# Altium footprint library CADTcommon.PcbLib: 503 footprints (part 29 of 32)
Each footprint in its own frame and in the unit in brackets; x right, y up, seen from the top. Pads: shape width x height; smd on the part's side, far side on the other; paste and mask are expansions set on the pad; w line width, h text height; cw(c..) or ccw(c..) is an arc to the next point about the centre after c.
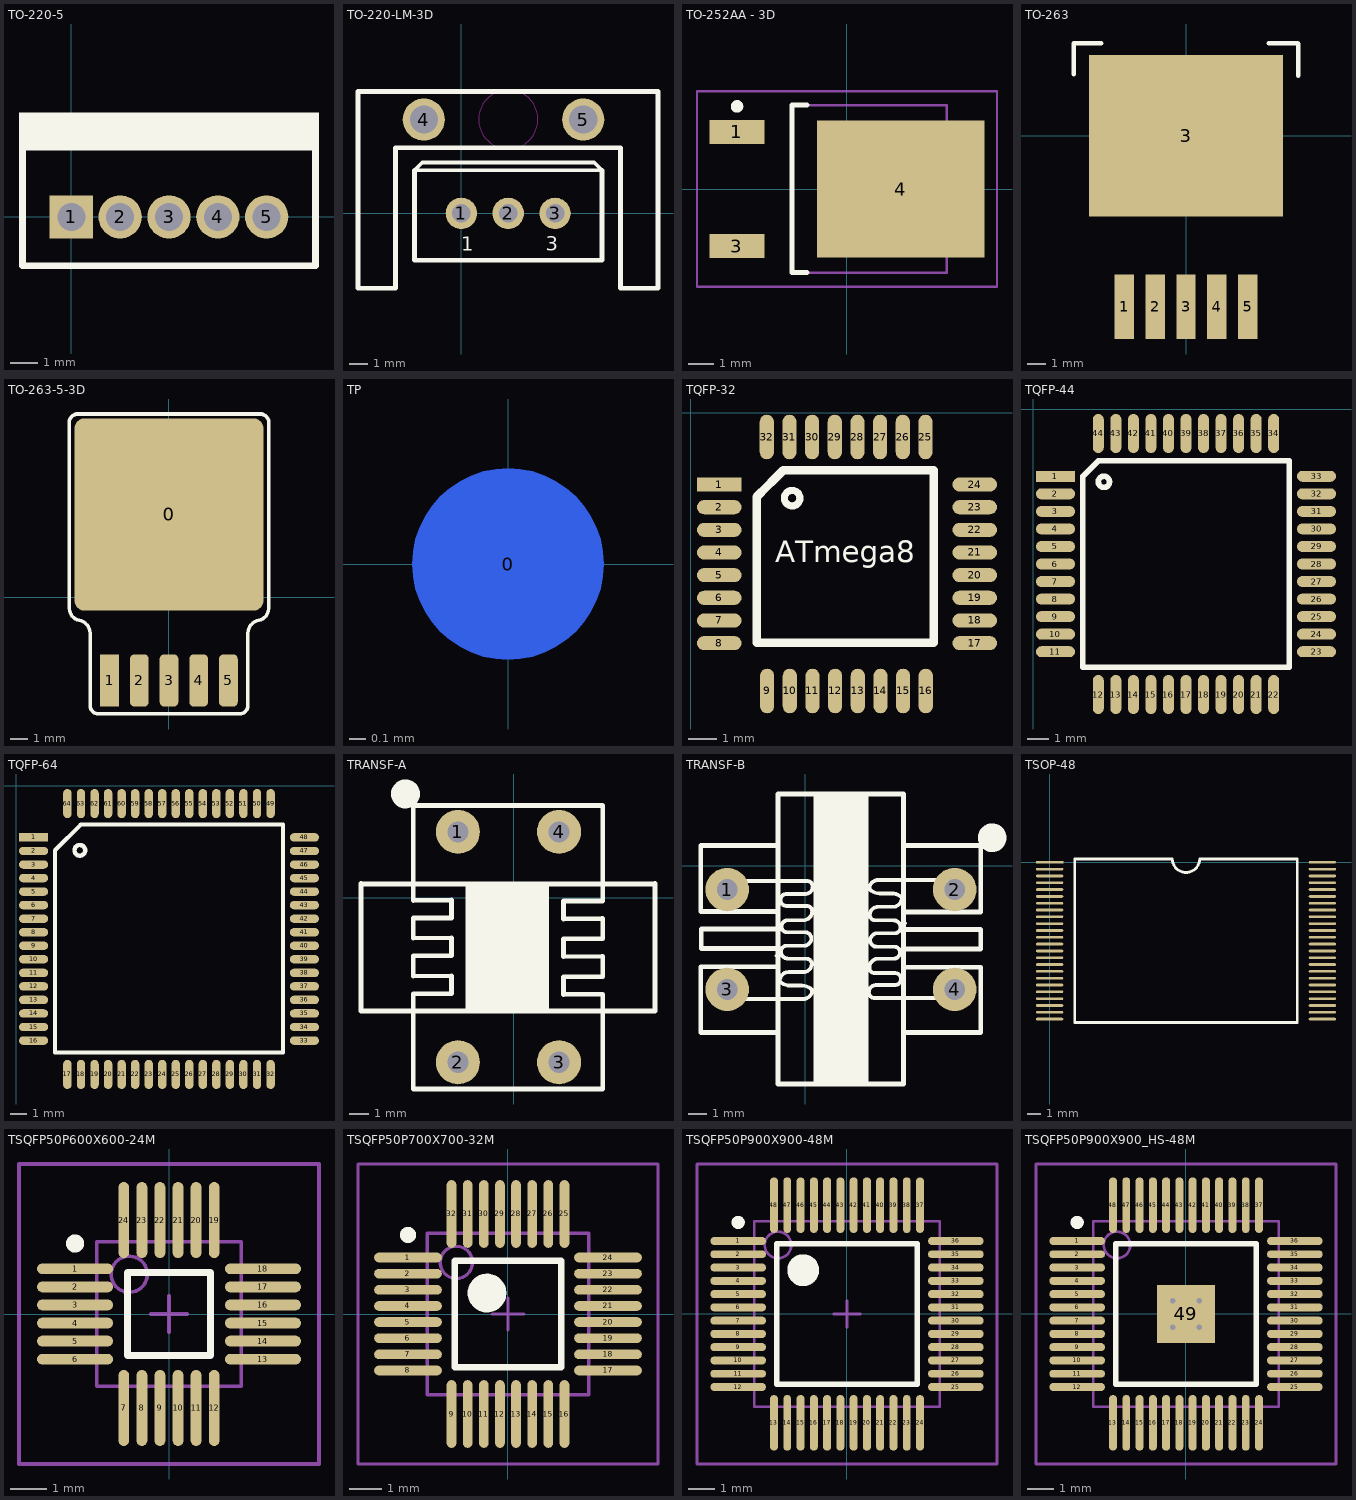
[diagram p28: the footprints below, top view; thin cyan lines are the x and y axes]

## TO-220-5 [mil]
pads (5):
  rect 62x62 hole 40: 1(0,0)
  round 62 hole 40: 2(70,0) 3(140,0) 4(210,0) 5(280,0)
Top Overlay:
  rectangle: -75,100 355,150
  lines w10: -70,-70 -70,100 350,100 350,-70 -70,-70

## TO-220-LM-3D [mm]
pads (5):
  round 1.7 hole 1: 1(0,0) 2(2.54,0) 3(5.08,0)
  round 2.286 hole 1.524: 4(-2.032,5.08) 5(6.604,5.08)
Top Overlay:
  lines w0.2: -2.54,2.328 -2.117,2.752 7.197,2.752 7.62,2.328 -2.54,2.328
  lines w0.254: -2.54,2.328 -2.54,-2.529 -2.529,-2.54 7.609,-2.54 7.62,-2.529 7.62,2.328 ; 10.657,3.556 10.657,6.604 ; 10.657,6.604 -5.599,6.604 -5.599,3.556 -5.599,1.016 -5.599,-4.064 -3.567,-4.064 -3.567,3.556 8.625,3.556 8.625,-4.064 10.657,-4.064 10.657,6.604
  text "1" at 0,-2.032 h0.76
  text "3" at 4.572,-2.032 h0.76
Keep-Out Layer:
  circle w0.025: c2.545,5.094 r1.606
3D body: height 21.07, standoff -4.86, extent -5.96,-5.775 11.04,4.445

## TO-252AA - 3D [mm] "D-PAK, 4-Leads, Body 6.1x6.5mm, Pitch 2.28mm, Lead Span 9.8mm, IPC Low Density"
height 2.38
pads (3):
  rect 2.2x0.95 smd: 1(-4.4,2.28) 3(-4.4,-2.28)
  rect 6.7x5.5 smd: 4(2.15,0)
Top Overlay:
  circle w0.25: c-4.4,3.305 r0.125
  lines w0.2: -1.6,-3.35 -2.2,-3.35 -2.2,3.35 -1.6,3.35
Mechanical 13:
  lines w0.1: -2.2,-3.35 -2.2,3.35 4,3.35 4,-3.35 -2.2,-3.35
Mechanical 15:
  lines w0.1: -0.5,0 0.5,0 ; 0,-0.5 0,0.5 ; -6,-3.9 -6,3.9 6,3.9 6,-3.9 -6,-3.9
3D body: height 2.39, standoff -0.02, extent -4.9,-3.27 5.038,3.27

## TO-263 [mil]
pads (6):
  rect 42x140 smd: 1(-134,-370) 2(-67,-370) 3(0,-370) 4(67,-370) 5(134,-370)
  rect 420x350 smd: 3(0,0)
Top Overlay:
  lines w10: -243,134 -243,201 -184,201 ; 179,201 242,201 243,200 243,130

## TO-263-5-3D [mm]
pads (6):
  rrect10% 10.8x11 smd: 0(0,4.75)
  rect 1.07x3 smd: 1(-3.4,-4.75)
  rrect50% 1.07x3 smd: 2(-1.7,-4.75) 3(0,-4.75) 4(1.7,-4.75) 5(3.4,-4.75)
Top Overlay:
  lines w0.2: -4.512,-6.122 ccw(c-4.028,-6.181) -4.125,-6.659 ; 4.125,-6.659 ccw(c4.028,-6.181) 4.512,-6.122
  lines w0.203: -5.7,10.05 -5.7,-0.53 ccw(c-5.005,-0.615) -5.145,-1.301 cw(c-5.306,-2.084) -4.512,-2.181 -4.512,-6.122 ; -5.7,10.109 cw(c-5.222,10.011) -5.299,10.493 ; -5.3,10.5 5.3,10.5 ; -4.125,-6.659 4.125,-6.659 ; 4.512,-6.122 4.512,-2.181 cw(c5.306,-2.084) 5.145,-1.301 ccw(c5.005,-0.615) 5.7,-0.53 5.7,10.05 ; 5.299,10.493 cw(c5.222,10.011) 5.7,10.109
3D body: height 4.48, standoff 0, extent -5.137,-4.801 5.086,9.55

## TP [mm]
pads (1):
  round 1.2 smd far side: 0(0,0)
Bottom Overlay:
  circle w0.2: c0,0 r0.94

## TQFP-32 [mil]
pads (32):
  rect 62x19.68 smd: 1(40,-100)
  oval 62x19.68 smd: 2(40,-131.5) 3(40,-162.99) 4(40,-194.49) 5(40,-225.98) 6(40,-257.48) 7(40,-288.98) 8(40,-320.47) 17(395,-320.47) 18(395,-288.98) 19(395,-257.48) 20(395,-225.98) 21(395,-194.49) 22(395,-162.99) 23(395,-131.5) 24(395,-100)
  oval 19.68x62 smd: 9(106.51,-387) 10(138.01,-387) 11(169.5,-387) 12(201,-387) 13(232.5,-387) 14(263.99,-387) 15(295.49,-387) 16(326.98,-387) 25(326.52,-33.95) 26(295.02,-33.95) 27(263.53,-33.95) 28(232.03,-33.95) 29(200.53,-33.95) 30(169.04,-33.95) 31(137.54,-33.95) 32(106.05,-33.95)
Top Overlay:
  circle w10: c141.23,-119 r10.77
  lines w12: 93,-116 129,-80 338,-80 338,-320 92,-320 92,-117 98.99,-110.01
  text "ATmega8" at 118,-208 h30

## TQFP-44 [mil]
pads (44):
  rect 70x19.68 smd: 1(40,-120)
  oval 70x19.68 smd: 2(40,-151.5) 3(40,-182.99) 4(40,-214.49) 5(40,-245.98) 6(40,-277.48) 7(40,-308.98) 8(40,-340.47) 9(40,-371.97) 10(40,-403.46) 11(40,-434.96) 23(508.5,-434.96) 24(508.5,-403.46) 25(508.5,-371.97) 26(508.5,-340.47) 27(508.5,-308.98) 28(508.5,-277.48) 29(508.5,-245.98) 30(508.5,-214.49) 31(508.5,-182.99) 32(508.5,-151.5) 33(508.5,-120)
  oval 19.68x70 smd: 12(116.77,-511.73) 13(148.27,-511.73) 14(179.76,-511.73) 15(211.26,-511.73) 16(242.76,-511.73) 17(274.25,-511.73) 18(305.75,-511.73) 19(337.24,-511.73) 20(368.74,-511.73) 21(400.24,-511.73) 22(431.73,-511.73) 34(431.73,-43.23) 35(400.24,-43.23) 36(368.74,-43.23) 37(337.24,-43.23) 38(305.75,-43.23) 39(274.25,-43.23) 40(242.76,-43.23) 41(211.26,-43.23) 42(179.76,-43.23) 43(148.27,-43.23) 44(116.77,-43.23)
Top Overlay:
  circle w10: c126.95,-130 r10.05
  lines w9.84: 89.21,-462.52 459.29,-462.52 459.29,-92.44
  lines w10: 89.21,-462.52 89.21,-120 116.77,-92.44 459.29,-92.44

## TQFP-64 [mm]
pads (64):
  rect 1.724x0.5 smd: 1(1.016,-3.044)
  oval 1.724x0.5 smd: 2(1.016,-3.844) 3(1.016,-4.644) 4(1.016,-5.444) 5(1.016,-6.244) 6(1.016,-7.044) 7(1.016,-7.844) 8(1.016,-8.644) 9(1.016,-9.444) 10(1.016,-10.244) 11(1.016,-11.044) 12(1.016,-11.844) 13(1.016,-12.644) 14(1.016,-13.444) 15(1.016,-14.244) 16(1.016,-15.044) 33(17.016,-15.044) 34(17.016,-14.244) 35(17.016,-13.444) 36(17.016,-12.644) 37(17.016,-11.844) 38(17.016,-11.044) 39(17.016,-10.244) 40(17.016,-9.444) 41(17.016,-8.644) 42(17.016,-7.844) 43(17.016,-7.044) 44(17.016,-6.244) 45(17.016,-5.444) 46(17.016,-4.644) 47(17.016,-3.844) 48(17.016,-3.044)
  oval 0.5x1.724 smd: 17(3.016,-17.044) 18(3.816,-17.044) 19(4.616,-17.044) 20(5.416,-17.044) 21(6.216,-17.044) 22(7.016,-17.044) 23(7.816,-17.044) 24(8.616,-17.044) 25(9.416,-17.044) 26(10.216,-17.044) 27(11.016,-17.044) 28(11.816,-17.044) 29(12.616,-17.044) 30(13.416,-17.044) 31(14.216,-17.044) 32(15.016,-17.044) 49(15.016,-1.044) 50(14.216,-1.044) 51(13.416,-1.044) 52(12.616,-1.044) 53(11.816,-1.044) 54(11.016,-1.044) 55(10.216,-1.044) 56(9.416,-1.044) 57(8.616,-1.044) 58(7.816,-1.044) 59(7.016,-1.044) 60(6.216,-1.044) 61(5.416,-1.044) 62(4.616,-1.044) 63(3.816,-1.044) 64(3.016,-1.044)
Top Overlay:
  circle w0.254: c3.748,-3.806 r0.316
  lines w0.254: 2.286,-15.744 15.748,-15.744 15.748,-2.282 3.81,-2.282 2.286,-3.806 2.286,-15.744

## TRANSF-A [mm]
pads (4):
  round 2.3 hole 1.1: 1(-2.921,3.454) 2(-2.921,-8.585) 3(2.362,-8.585) 4(2.362,3.454)
Top Overlay:
  circle w1: c-5.665,5.436 r0.255
  rectangle: -2.515,-5.944 1.829,0.66
  lines w0.254: -7.976,0.737 7.366,0.737 ; -7.976,0.749 -7.976,-5.905 7.366,-5.905 7.366,0.749 ; -5.258,-6.071 -5.258,-5.004 ; 4.597,-5.029 2.591,-5.055 2.591,-4.115 4.597,-4.115 ; 4.597,-3.048 2.591,-3.073 2.591,-2.134 4.597,-2.134 ; 4.597,-1.067 2.591,-1.092 2.591,-0.152 4.597,-0.152 ; 4.648,-5.029 4.648,-9.982 -5.258,-9.982 -5.258,-5.004 ; 4.648,-4.115 4.648,-3.048 ; 4.648,-2.134 4.648,-1.067 ; 4.648,-0.152 4.648,4.826 -5.258,4.826 -5.258,-0.127 -3.251,-0.102 -3.251,-1.041 -5.258,-1.041 ; -5.258,-5.004 -3.251,-5.004 -3.251,-4.064 -5.258,-4.089 ; -5.258,-4.089 -5.258,-3.023 ; -5.258,-4.089 -5.258,-3.023 ; -5.258,-3.023 -3.251,-3.023 -3.251,-2.083 -5.258,-2.108 ; -5.258,-2.108 -5.258,-1.041 ; -5.258,-2.108 -5.258,-1.041
3D body: height 12, standoff -4, extent -7.976,-9.957 7.264,5.055

## TRANSF-B [mm]
pads (4):
  round 2.3 hole 1.1: 1(-4.14,-1.27) 2(7.899,-1.27) 3(-4.14,-6.553) 4(7.899,-6.553)
Top Overlay:
  circle w1: c9.881,1.474 r0.255
  region: 0.432,3.683 0.432,-11.557 3.327,-11.557 3.327,3.683
  lines w0.2: -3.607,-7.061 -0.344,-7.061 -0.127,-7.061 ccw(c-0.127,-6.579) 0.356,-6.579 ccw(c-0.196,-7.13) -0.196,-6.35 -0.437,-6.35 -0.82,-6.35 cw(c-0.82,-5.57) -1.372,-6.121 cw(c-0.889,-6.121) -0.889,-5.639 -0.102,-5.639 ccw(c-0.102,-5.207) 0.33,-5.207 ccw(c0.051,-5.207) 0.051,-4.928 -0.914,-4.928 cw(c-0.914,-4.547) -1.295,-4.547 cw(c-0.991,-4.547) -0.991,-4.242 -0.076,-4.242 ccw(c-0.076,-3.861) 0.305,-3.861 ccw(c-0.025,-3.861) -0.025,-3.531 -0.965,-3.531 cw(c-0.965,-3.226) -1.27,-3.226 cw(c-0.94,-3.226) -0.94,-2.896 -0.127,-2.896 ccw(c-0.127,-2.413) 0.356,-2.413 ccw(c0.076,-2.413) 0.076,-2.134 -1.016,-2.134 cw(c-1.016,-1.829) -1.321,-1.829 cw(c-0.991,-1.829) -0.991,-1.499 0,-1.499 ccw(c0,-1.118) 0.381,-1.118 ccw(c0.076,-1.118) 0.076,-0.813 -3.581,-0.813 ; 7.315,-7.01 3.658,-7.01 cw(c3.658,-6.706) 3.353,-6.706 cw(c3.734,-6.706) 3.734,-6.325 4.724,-6.325 ccw(c4.724,-5.994) 5.055,-5.994 ccw(c4.75,-5.994) 4.75,-5.69 3.658,-5.69 cw(c3.658,-5.41) 3.378,-5.41 cw(c3.861,-5.41) 3.861,-4.928 4.674,-4.928 ccw(c4.674,-4.597) 5.004,-4.597 ccw(c4.699,-4.597) 4.699,-4.293 3.759,-4.293 cw(c3.759,-3.962) 3.429,-3.962 cw(c3.81,-3.962) 3.81,-3.581 4.724,-3.581 ccw(c4.724,-3.277) 5.029,-3.277 ccw(c4.648,-3.277) 4.648,-2.896 3.683,-2.896 cw(c3.683,-2.616) 3.404,-2.616 cw(c3.835,-2.616) 3.835,-2.184 4.623,-2.184 ccw(c4.623,-1.702) 5.105,-1.702 ccw(c4.554,-2.254) 4.554,-1.473 4.171,-1.473 3.93,-1.473 cw(c3.93,-0.693) 3.378,-1.245 cw(c3.861,-1.245) 3.861,-0.762 4.078,-0.762 7.341,-0.762
  lines w0.254: -5.537,-5.359 -5.537,-8.839 -1.46,-8.839 ; -5.537,-2.438 -5.537,1.067 -1.46,1.067 ; -5.512,-5.359 -1.46,-5.359 ; -5.512,-2.438 -1.499,-2.438 ; -1.509,-4.775 cw(c-1.509,-4.862) -1.448,-4.801 ; -1.46,-4.394 -5.512,-4.394 -5.512,-3.353 -1.448,-3.353 ; -1.46,-2.475 -1.46,-5.359 ; -1.46,-2.438 -1.46,3.785 5.182,3.785 5.182,1.067 ; -1.448,-5.69 -1.448,-4.775 ; -1.448,-3.734 -1.448,-2.769 ; 5.182,-11.557 5.182,-8.839 9.271,-8.839 9.271,-5.385 5.182,-5.385 ; 5.182,-8.788 5.182,1.067 ; 5.182,-5.055 5.182,-4.089 ; 5.182,-4.42 9.271,-4.42 ; 5.182,-3.048 5.182,-2.134 ; 5.182,-3.023 ccw(c5.243,-2.961) 5.243,-3.048 ; 5.182,-2.464 9.195,-2.464 ; 5.194,-11.557 -1.46,-11.557 -1.46,-5.359 ; 5.243,-3.378 9.195,-3.378 ; 9.271,-4.343 9.271,-3.378 ; 9.271,-2.464 9.271,1.067 5.182,1.067
3D body: height 11.5, standoff -5.5, extent -5.469,-11.384 9.33,3.816

## TSOP-48 [mm]
pads (48):
  rect 2x0.2 smd: 1(0,0)
  oval 2x0.2 smd: 2(0,-0.5) 3(0,-1) 4(0,-1.5) 5(0,-2) 6(0,-2.5) 7(0,-3) 8(0,-3.5) 9(0,-4) 10(0,-4.5) 11(0,-5) 12(0,-5.5) 13(0,-6) 14(0,-6.5) 15(0,-7) 16(0,-7.5) 17(0,-8) 18(0,-8.5) 19(0,-9) 20(0,-9.5) 21(0,-10) 22(0,-10.5) 23(0,-11) 24(0,-11.5) 25(20,-11.5) 26(20,-11) 27(20,-10.5) 28(20,-10) 29(20,-9.5) 30(20,-9) 31(20,-8.5) 32(20,-8) 33(20,-7.5) 34(20,-7) 35(20,-6.5) 36(20,-6) 37(20,-5.5) 38(20,-5) 39(20,-4.5) 40(20,-4) 41(20,-3.5) 42(20,-3) 43(20,-2.5) 44(20,-2) 45(20,-1.5) 46(20,-1) 47(20,-0.5) 48(20,0)
Top Overlay:
  lines w0.2: 1.835,-11.75 18.165,-11.75 18.165,0.25 11,0.25 cw(c10,0.25) 9,0.25 1.835,0.25 1.835,-11.75
3D body: height 1.1, standoff 0, extent -0.045,-11.746 19.959,0.254

## TSQFP50P600X600-24M [mm] "Thin QFP, 24-Leads, Body 4x4mm, Pitch 0.5mm, IPC Low Density"
height 1.2
pads (24):
  oval 2.1x0.3 smd: 1(-2.6,1.25) 2(-2.6,0.75) 3(-2.6,0.25) 4(-2.6,-0.25) 5(-2.6,-0.75) 6(-2.6,-1.25) 13(2.6,-1.25) 14(2.6,-0.75) 15(2.6,-0.25) 16(2.6,0.25) 17(2.6,0.75) 18(2.6,1.25)
  oval 0.3x2.1 smd: 7(-1.25,-2.6) 8(-0.75,-2.6) 9(-0.25,-2.6) 10(0.25,-2.6) 11(0.75,-2.6) 12(1.25,-2.6) 19(1.25,2.6) 20(0.75,2.6) 21(0.25,2.6) 22(-0.25,2.6) 23(-0.75,2.6) 24(-1.25,2.6)
Top Overlay:
  circle w0.25: c-2.6,1.95 r0.125
  lines w0.2: -1.15,-1.15 -1.15,1.15 1.15,1.15 1.15,-1.15 -1.15,-1.15
Mechanical 13:
  circle w0.1: c-1.1,1.1 r0.5
  lines w0.1: -2,-2 -2,2 2,2 2,-2 -2,-2
Mechanical 15:
  lines w0.1: -0.5,0 0.5,0 ; 0,-0.5 0,0.5 ; -4.15,-4.15 -4.15,4.15 4.15,4.15 4.15,-4.15 -4.15,-4.15
3D body: height 1.2, standoff 0, extent -2,-2 2,2

## TSQFP50P700X700-32M [mm] "Thin QFP, 32-Leads, Body 5x5mm, Pitch 0.5mm, IPC Low Density"
height 1.2
pads (32):
  oval 2.1x0.3 smd: 1(-3.1,1.75) 2(-3.1,1.25) 3(-3.1,0.75) 4(-3.1,0.25) 5(-3.1,-0.25) 6(-3.1,-0.75) 7(-3.1,-1.25) 8(-3.1,-1.75) 17(3.1,-1.75) 18(3.1,-1.25) 19(3.1,-0.75) 20(3.1,-0.25) 21(3.1,0.25) 22(3.1,0.75) 23(3.1,1.25) 24(3.1,1.75)
  oval 0.3x2.1 smd: 9(-1.75,-3.1) 10(-1.25,-3.1) 11(-0.75,-3.1) 12(-0.25,-3.1) 13(0.25,-3.1) 14(0.75,-3.1) 15(1.25,-3.1) 16(1.75,-3.1) 25(1.75,3.1) 26(1.25,3.1) 27(0.75,3.1) 28(0.25,3.1) 29(-0.25,3.1) 30(-0.75,3.1) 31(-1.25,3.1) 32(-1.75,3.1)
Top Overlay:
  circle w0.6: c-0.65,0.65 r0.3
  circle w0.25: c-3.1,2.45 r0.125
  lines w0.2: -1.65,-1.65 1.65,-1.65 1.65,1.65 -1.65,1.65 -1.65,-1.65
Mechanical 13:
  circle w0.1: c-1.6,1.6 r0.5
  lines w0.1: -2.5,-2.5 2.5,-2.5 2.5,2.5 -2.5,2.5 -2.5,-2.5
Mechanical 15:
  lines w0.1: -0.5,0 0.5,0 ; 0,-0.5 0,0.5 ; -4.65,-4.65 4.65,-4.65 4.65,4.65 -4.65,4.65 -4.65,-4.65
3D body: height 1.2, standoff 0, extent -2.5,-2.5 2.5,2.5

## TSQFP50P900X900-48M [mm] "Thin QFP, 48-Leads, Body 7x7mm, Pitch 0.5mm, IPC Low Density"
height 1.6
pads (48):
  oval 2.1x0.3 smd: 1(-4.1,2.75) 2(-4.1,2.25) 3(-4.1,1.75) 4(-4.1,1.25) 5(-4.1,0.75) 6(-4.1,0.25) 7(-4.1,-0.25) 8(-4.1,-0.75) 9(-4.1,-1.25) 10(-4.1,-1.75) 11(-4.1,-2.25) 12(-4.1,-2.75) 25(4.1,-2.75) 26(4.1,-2.25) 27(4.1,-1.75) 28(4.1,-1.25) 29(4.1,-0.75) 30(4.1,-0.25) 31(4.1,0.25) 32(4.1,0.75) 33(4.1,1.25) 34(4.1,1.75) 35(4.1,2.25) 36(4.1,2.75)
  oval 0.3x2.1 smd: 13(-2.75,-4.1) 14(-2.25,-4.1) 15(-1.75,-4.1) 16(-1.25,-4.1) 17(-0.75,-4.1) 18(-0.25,-4.1) 19(0.25,-4.1) 20(0.75,-4.1) 21(1.25,-4.1) 22(1.75,-4.1) 23(2.25,-4.1) 24(2.75,-4.1) 37(2.75,4.1) 38(2.25,4.1) 39(1.75,4.1) 40(1.25,4.1) 41(0.75,4.1) 42(0.25,4.1) 43(-0.25,4.1) 44(-0.75,4.1) 45(-1.25,4.1) 46(-1.75,4.1) 47(-2.25,4.1) 48(-2.75,4.1)
Top Overlay:
  circle w0.25: c-4.1,3.45 r0.125
  circle w0.6: c-1.65,1.65 r0.3
  lines w0.2: -2.65,-2.65 -2.65,2.65 2.65,2.65 2.65,-2.65 -2.65,-2.65
Mechanical 13:
  circle w0.1: c-2.6,2.6 r0.5
  lines w0.1: -3.5,-3.5 -3.5,3.5 3.5,3.5 3.5,-3.5 -3.5,-3.5
Mechanical 15:
  lines w0.1: -0.5,0 0.5,0 ; 0,-0.5 0,0.5 ; -5.65,-5.65 -5.65,5.65 5.65,5.65 5.65,-5.65 -5.65,-5.65
3D body: height 1.6, standoff 0, extent -3.5,-3.5 3.5,3.5

## TSQFP50P900X900_HS-48M [mm] "Thin QFP, 48-Leads, Body 7x7mm, Pitch 0.5mm, Exposed Pad, IPC Low Density"
height 1.6
pads (49):
  oval 2.1x0.3 smd: 1(-4.1,2.75) 2(-4.1,2.25) 3(-4.1,1.75) 4(-4.1,1.25) 5(-4.1,0.75) 6(-4.1,0.25) 7(-4.1,-0.25) 8(-4.1,-0.75) 9(-4.1,-1.25) 10(-4.1,-1.75) 11(-4.1,-2.25) 12(-4.1,-2.75) 25(4.1,-2.75) 26(4.1,-2.25) 27(4.1,-1.75) 28(4.1,-1.25) 29(4.1,-0.75) 30(4.1,-0.25) 31(4.1,0.25) 32(4.1,0.75) 33(4.1,1.25) 34(4.1,1.75) 35(4.1,2.25) 36(4.1,2.75)
  oval 0.3x2.1 smd: 13(-2.75,-4.1) 14(-2.25,-4.1) 15(-1.75,-4.1) 16(-1.25,-4.1) 17(-0.75,-4.1) 18(-0.25,-4.1) 19(0.25,-4.1) 20(0.75,-4.1) 21(1.25,-4.1) 22(1.75,-4.1) 23(2.25,-4.1) 24(2.75,-4.1) 37(2.75,4.1) 38(2.25,4.1) 39(1.75,4.1) 40(1.25,4.1) 41(0.75,4.1) 42(0.25,4.1) 43(-0.25,4.1) 44(-0.75,4.1) 45(-1.25,4.1) 46(-1.75,4.1) 47(-2.25,4.1) 48(-2.75,4.1)
  rect 2.2x2.2 smd: 49(0,0)
via -0.5,0.5 diameter 0.5 hole 0.2
via 0.5,0.5 diameter 0.5 hole 0.2
via -0.5,-0.5 diameter 0.5 hole 0.2
via 0.5,-0.5 diameter 0.5 hole 0.2
Top Overlay:
  circle w0.25: c-4.1,3.45 r0.125
  lines w0.2: -2.65,-2.65 -2.65,2.65 2.65,2.65 2.65,-2.65 -2.65,-2.65
Mechanical 13:
  circle w0.1: c-2.6,2.6 r0.5
  lines w0.1: -3.5,-3.5 -3.5,3.5 3.5,3.5 3.5,-3.5 -3.5,-3.5
Mechanical 15:
  lines w0.1: -0.5,0 0.5,0 ; 0,-0.5 0,0.5 ; -5.65,-5.65 -5.65,5.65 5.65,5.65 5.65,-5.65 -5.65,-5.65
3D body: height 1.6, standoff 0, extent -3.5,-3.5 3.5,3.5